# Altium footprint library 声源跟踪小车原封装库.PcbLib: 38 footprints (part 3 of 3)
Each footprint in its own frame and in the unit in brackets; x right, y up, seen from the top. Pads: shape width x height; smd on the part's side, far side on the other; paste and mask are expansions set on the pad; w line width, h text height; cw(c..) or ccw(c..) is an arc to the next point about the centre after c.
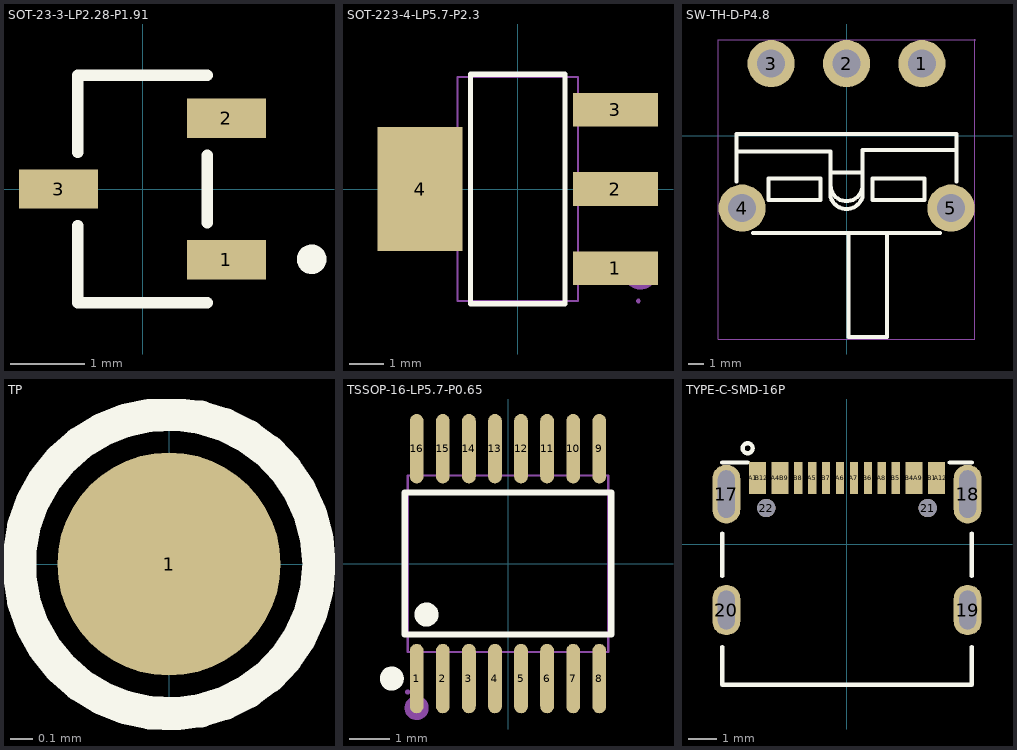
[diagram p2: the footprints below, top view; thin cyan lines are the x and y axes]

## SOT-23-3-LP2.28-P1.91 [mm] "SOT-23-3_L2.9-W1.4-P1.91-LS2.6-BR"
pads (3):
  rect 1.07x0.532 smd: 1(1.135,-0.955) 2(1.135,0.955) 3(-1.135,0)
Top Overlay:
  circle w0.2: c2.286,-0.95 r0.1
  lines w0.152: -0.876,-0.495 -0.876,-1.536 0.876,-1.536 ; -0.876,0.495 -0.876,1.536 0.876,1.536 ; 0.876,-0.455 0.876,0.455
3D body: height 0.5, standoff 0, extent 0.635,-1.209 1.397,-0.701
3D body: height 0.5, standoff 0, extent 0.635,0.701 1.397,1.209
3D body: height 1.11, standoff 0, extent -0.876,-1.536 0.876,1.536
3D body: height 0.5, standoff 0, extent -1.397,-0.254 -0.635,0.254

## SOT-223-4-LP5.7-P2.3 [mil] "SOT-223-4_L6.5-W3.5-P2.30-LS7.0-BR"
pads (4):
  rect 97.2x38.6 smd mask+2: 1(111.6,-90.5) 2(111.6,0) 3(111.6,90.6)
  rect 97.2x141.7 smd mask+2: 4(-111.6,0)
Top Overlay:
  lines w6: -54,-131 54,-131 54,131 -54,131 -54,-131
Mechanical 2:
  circle w19.7: c140,-95 r9.8
  region: 140.2,-127.9 140.2,-126.91 138.79,-125.5 136.81,-125.5 135.4,-126.91 135.4,-127.9 135.4,-128.89 136.81,-130.3 138.79,-130.3 140.2,-128.89
  region: -100.8,-59.1 -100.8,59.1 -68.5,59.1 -68.5,-59.1
  region: -100.4,-59.1 -100.4,59.1 -137.8,59.1 -137.8,-59.1
  region: 68.5,76.8 68.5,104.3 100.8,104.3 100.8,76.8
  region: 100.4,76.8 100.4,104.3 137.8,104.3 137.8,76.8
  region: 68.5,-13.8 68.5,13.8 100.8,13.8 100.8,-13.8
  region: 100.4,-13.8 100.4,13.8 137.8,13.8 137.8,-13.8
  region: 68.5,-104.3 68.5,-76.8 100.8,-76.8 100.8,-104.3
  region: 100.4,-104.3 100.4,-76.8 137.8,-76.8 137.8,-104.3
  lines w2: -68.9,-128 68.9,-128 68.9,128 -68.9,128 -68.9,-128
3D body "SOT-223-4-LP5.7-P2.3.step": height 66.93, standoff 0, extent -137.8,-127.95 137.8,127.95

## SW-TH-D-P4.8 [mil] "SW-TH_SS-12D11G5"
pads (5):
  round 118.1 hole 70.9 mask+2: 1(189,181.1) 2(0,181.1) 3(-189,181.1) 4(-261.8,-181.1) 5(261.8,-181.1)
Top Overlay:
  lines w10: -275.6,-114.4 -275.6,4.7 ; -275.6,-38.9 -40,-38.9 -40,-123.9 ccw(c0,-123.9) 40,-123.9 40,-35.4 275.6,-35.4 ; -275.6,5.1 275.6,5.1 275.6,-114.4 ; -234.1,-243.3 234.1,-243.3 ; -40,-115.1 -40,-153.9 ccw(c0,-141.48) 40,-153.9 40,-115.1 ; -40,-91.6 40,-91.6 ; 5,-504.2 5,-243.6 ; 5,-503.9 101.5,-503.9 101.5,-243.3 ; -195,-161.4 -195,-106.4 -65,-106.4 -65,-161.4 -195,-161.4 ; 65,-161.4 65,-106.4 195,-106.4 195,-161.4 65,-161.4
Mechanical 2:
  region: 293.3,-181.1 293.3,-176.95 291.15,-168.94 287.01,-161.76 281.14,-155.89 273.96,-151.75 265.95,-149.6 257.65,-149.6 249.64,-151.75 242.46,-155.89 236.59,-161.76 232.45,-168.94 230.3,-176.95 230.3,-181.1 230.3,-185.25 232.45,-193.26 236.59,-200.44 242.46,-206.31 249.64,-210.45 257.65,-212.6 265.95,-212.6 273.96,-210.45 281.14,-206.31 287.01,-200.44 291.15,-193.26 293.3,-185.25
  region: -230.3,-181.1 -230.3,-176.95 -232.45,-168.94 -236.59,-161.76 -242.46,-155.89 -249.64,-151.75 -257.65,-149.6 -265.95,-149.6 -273.96,-151.75 -281.14,-155.89 -287.01,-161.76 -291.15,-168.94 -293.3,-176.95 -293.3,-181.1 -293.3,-185.25 -291.15,-193.26 -287.01,-200.44 -281.14,-206.31 -273.96,-210.45 -265.95,-212.6 -257.65,-212.6 -249.64,-210.45 -242.46,-206.31 -236.59,-200.44 -232.45,-193.26 -230.3,-185.25
  region: -157.5,181.1 -157.5,185.25 -159.65,193.26 -163.79,200.44 -169.66,206.31 -176.84,210.45 -184.85,212.6 -193.15,212.6 -201.16,210.45 -208.34,206.31 -214.21,200.44 -218.35,193.26 -220.5,185.25 -220.5,181.1 -220.5,176.95 -218.35,168.94 -214.21,161.76 -208.34,155.89 -201.16,151.75 -193.15,149.6 -184.85,149.6 -176.84,151.75 -169.66,155.89 -163.79,161.76 -159.65,168.94 -157.5,176.95
  region: 31.5,181.1 31.5,185.25 29.35,193.26 25.21,200.44 19.34,206.31 12.16,210.45 4.15,212.6 -4.15,212.6 -12.16,210.45 -19.34,206.31 -25.21,200.44 -29.35,193.26 -31.5,185.25 -31.5,181.1 -31.5,176.95 -29.35,168.94 -25.21,161.76 -19.34,155.89 -12.16,151.75 -4.15,149.6 4.15,149.6 12.16,151.75 19.34,155.89 25.21,161.76 29.35,168.94 31.5,176.95
  region: 220.5,181.1 220.5,185.25 218.35,193.26 214.21,200.44 208.34,206.31 201.16,210.45 193.15,212.6 184.85,212.6 176.84,210.45 169.66,206.31 163.79,200.44 159.65,193.26 157.5,185.25 157.5,181.1 157.5,176.95 159.65,168.94 163.79,161.76 169.66,155.89 176.84,151.75 184.85,149.6 193.15,149.6 201.16,151.75 208.34,155.89 214.21,161.76 218.35,168.94 220.5,176.95
  region: 323.3,240.2 323.3,241.19 321.89,242.6 319.91,242.6 318.5,241.19 318.5,240.2 318.5,239.21 319.91,237.8 321.89,237.8 323.3,239.21
  lines w2: -320.9,-509.2 -320.9,240.2 320.9,240.2 320.9,-509.2 -320.9,-509.2
3D body "SW-TH-D-P4.8.step": height 259.54, standoff -126.08, extent -265.73,-439.9 265.73,207.7

## TP [mil] "TP测试点"
pads (1):
  round 40 smd: 1(0,0)
Top Overlay:
  circle w6: c0,0 r26.87

## TSSOP-16-LP5.7-P0.65 [mil] "TSSOP-16_L5.0-W4.4-P0.65-LS6.4-BL"
pads (16):
  oval 13.5x68.2 smd mask+2: 1(-89.6,-112.8) 2(-64,-112.8) 3(-38.4,-112.8) 4(-12.8,-112.8) 5(12.8,-112.8) 6(38.4,-112.8) 7(64,-112.8) 8(89.6,-112.8) 9(89.6,112.8) 10(64,112.8) 11(38.4,112.8) 12(12.8,112.8) 13(-12.8,112.8) 14(-38.4,112.8) 15(-64,112.8) 16(-89.6,112.8)
Top Overlay:
  circle w11.8: c-80,-50 r5.9
  circle w11.8: c-114.1,-112.8 r5.9
  lines w6: -101.4,-69.7 -101.4,69.7 101.4,69.7 101.4,-69.7 -101.4,-69.7
Mechanical 2:
  drawing of 38 lines, arcs and shapes, not listed
3D body "TSSOP-16-LP5.7-P0.65.step": height 40.34, standoff -1.01, extent -98.43,-130.1 98.43,122.1

## TYPE-C-SMD-16P [mm]
pads (22):
  oval 1x2.1 hole 0.6 slot 1.7 at 90 deg: 17(-4.32,1.787) 18(4.32,1.787)
  oval 1x1.8 hole 0.6 slot 1.4 at 90 deg: 19(4.32,-2.362) 20(-4.32,-2.362)
  round 0.65 hole 0.65 unplated: 21(2.89,1.288) 22(-2.89,1.288)
  rect 0.3x1.15 smd: A1(-3.35,2.362) A4(-2.55,2.362) A5(-1.25,2.362) A6(-0.25,2.362) A7(0.25,2.362) A8(1.25,2.362) A9(2.55,2.362) A12(3.35,2.362) B1(3.05,2.362) B4(2.25,2.362) B5(1.75,2.362) B6(0.75,2.362) B7(-0.75,2.362) B8(-1.75,2.362) B9(-2.25,2.362) B12(-3.05,2.362)
Top Overlay:
  circle w0.152: c-3.556,3.429 r0.18
  lines w0.152: -4.47,-3.683 -4.47,-5.039 4.47,-5.039 4.47,-3.683 ; -4.47,0 -4.47,-1.143 -4.47,0.381 ; -4.47,2.921 -3.556,2.921 ; -3.429,-5.039 0.127,-5.039 ; 3.683,2.921 4.47,2.921 ; 4.47,0 4.47,-1.143 4.47,0.381